# Altium integrated library 7490120110_Altium_WE-LAN_rev20b.IntLib: 42 symbols
Pins are listed as number, name and electrical type; pins without a type are passive.

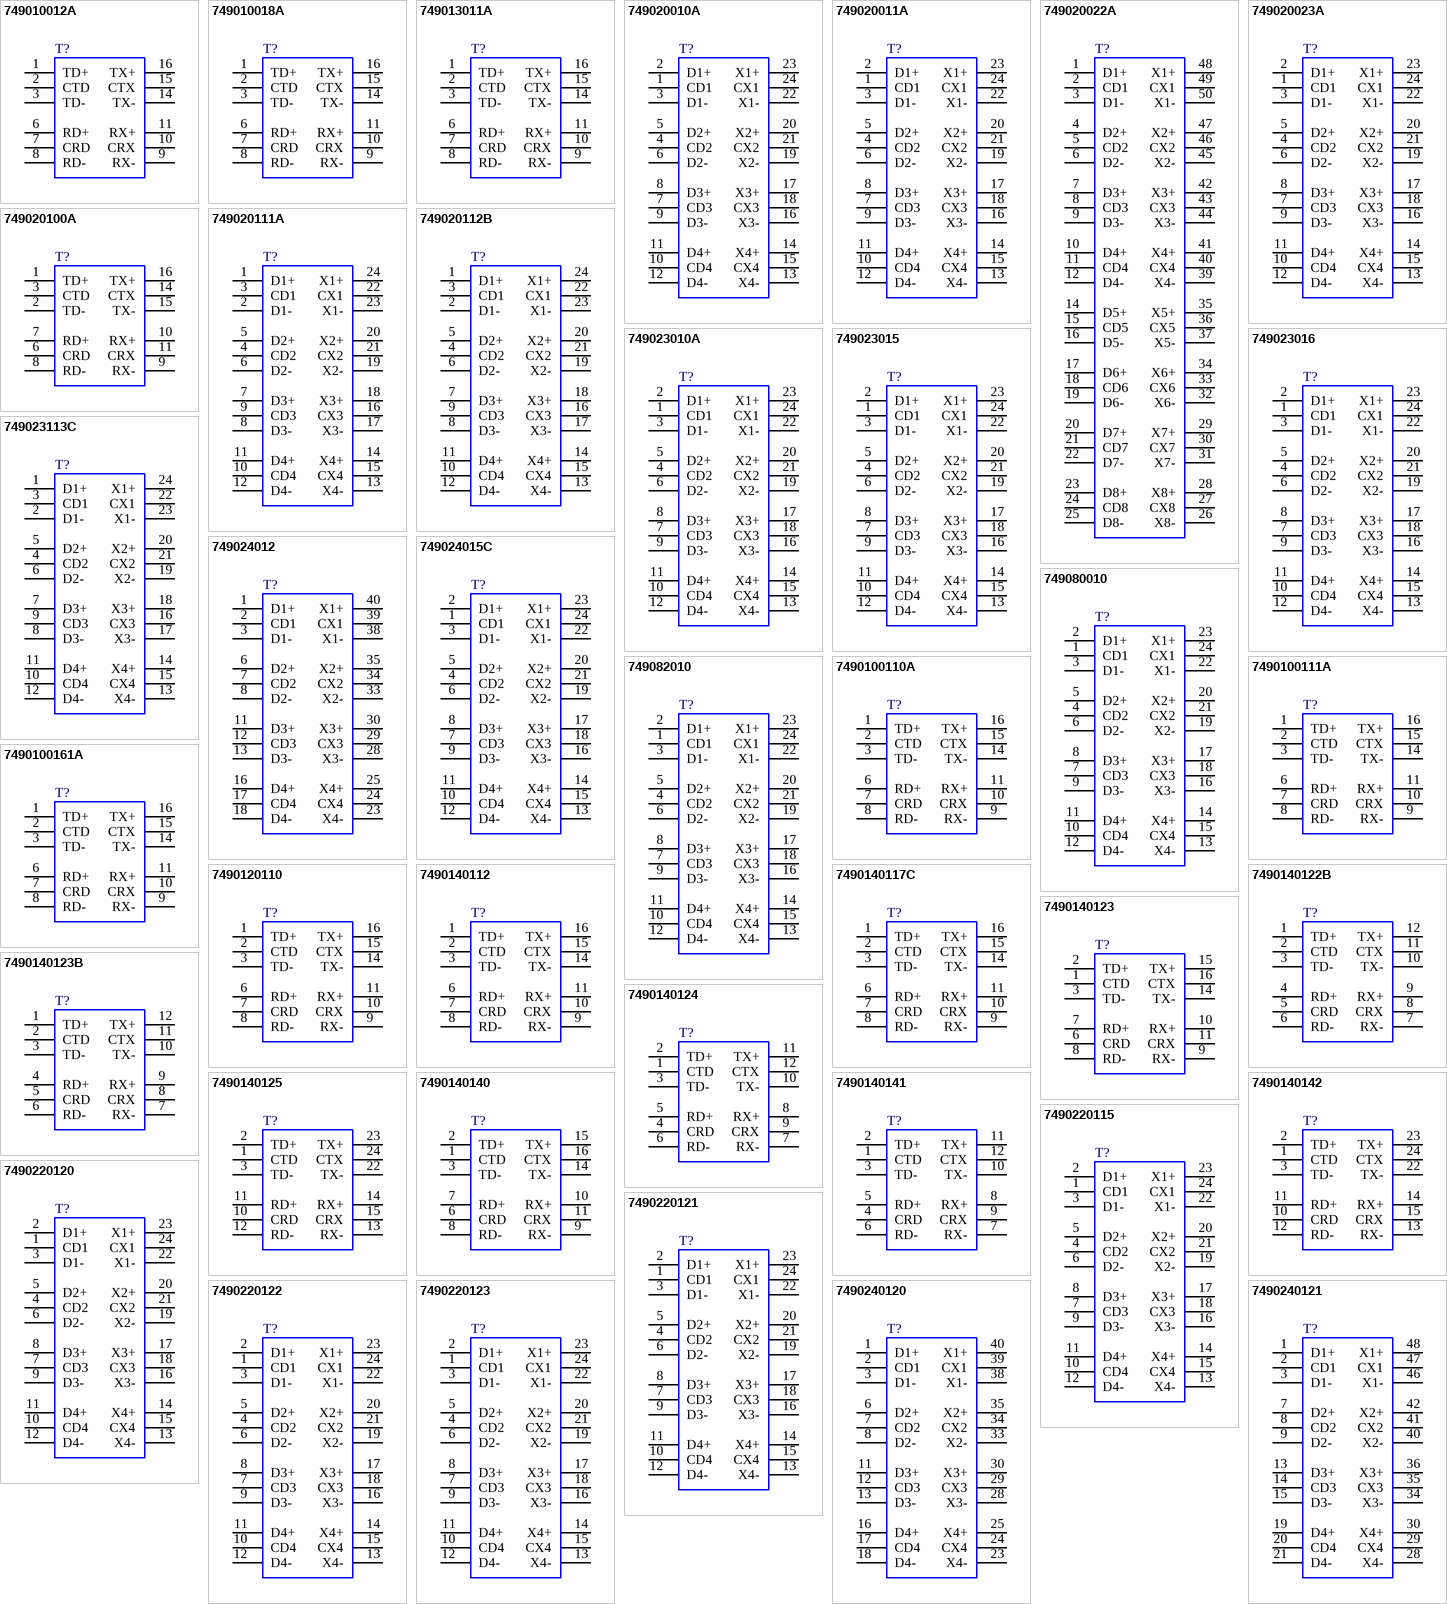
[diagram p0: symbols 749010012A to 7490240121]

## 749010012A
designator T?
WE-LAN LAN Transformer, SMT, 10/100 Base-T, 1 port; Manufacturer Part Number: 749010012A; Manufacturer: Wurth Elektronik; PoE Current: 0; Turns Ratio: 1:1; HPLE: No; Number of Ports: 1; Inductance: 350uH; Insulation Test Voltage: 1500Vrms; ComponentLink1Description: Manufacturer; ComponentLink1URL: http://www.we-online.de; ComponentLink2Description: Datasheet; ComponentLink2URL: https://www.we-online.com/catalog/datasheet/749010012A.pdf; Operating Temperature: 0 to +70degC; Published Date: March 2020; Packaging: Tape and Reel; Data Rate: 10/100 Base-T; Mounting Technology: SMT
footprint 749010012A
pins: 1 TD+, 2 CTD, 3 TD-, 6 RD+, 7 CRD, 8 RD-, 9 RX-, 10 CRX, 11 RX+, 14 TX-, 15 CTX, 16 TX+

## 749010018A
designator T?
WE-LAN LAN Transformer, SMT, 10/100 Base-T, 1 port; Manufacturer Part Number: 749010018A; Manufacturer: Wurth Elektronik; PoE Current: 0; Turns Ratio: 1:1; HPLE: No; Number of Ports: 1; Inductance: 350uH; Insulation Test Voltage: 1500Vrms; ComponentLink1Description: Manufacturer; ComponentLink1URL: http://www.we-online.de; ComponentLink2Description: Datasheet; ComponentLink2URL: https://www.we-online.com/catalog/datasheet/749010018A.pdf; Operating Temperature: -40 to +85degC; Published Date: March 2020; Packaging: Tape and Reel; Data Rate: 10/100 Base-T; Mounting Technology: SMT
footprint 749010018A
pins: 1 TD+, 2 CTD, 3 TD-, 6 RD+, 7 CRD, 8 RD-, 9 RX-, 10 CRX, 11 RX+, 14 TX-, 15 CTX, 16 TX+

## 749013011A
designator T?
WE-LAN LAN Transformer, SMT, 10/100 Base-T, 1 port; Manufacturer Part Number: 749013011A; Manufacturer: Wurth Elektronik; PoE Current: 350mA; Turns Ratio: 1:1; HPLE: No; Number of Ports: 1; Inductance: 350uH; Insulation Test Voltage: 1500Vrms; ComponentLink1Description: Manufacturer; ComponentLink1URL: http://www.we-online.de; ComponentLink2Description: Datasheet; ComponentLink2URL: https://www.we-online.com/catalog/datasheet/749013011A.pdf; Operating Temperature: -40 to +105degC; Published Date: March 2020; Packaging: Tape and Reel; Data Rate: 10/100 Base-T; Mounting Technology: SMT
footprint 749013011A
pins: 1 TD+, 2 CTD, 3 TD-, 6 RD+, 7 CRD, 8 RD-, 9 RX-, 10 CRX, 11 RX+, 14 TX-, 15 CTX, 16 TX+

## 749020010A
designator T?
WE-LAN LAN Transformer, SMT, 1000 Base-T, 1 port; Manufacturer Part Number: 749020010A; Manufacturer: Wurth Elektronik; PoE Current: 0; Turns Ratio: 1:1; HPLE: No; Number of Ports: 1; Inductance: 350uH; Insulation Test Voltage: 1500Vrms; ComponentLink1Description: Manufacturer; ComponentLink1URL: http://www.we-online.de; ComponentLink2Description: Datasheet; ComponentLink2URL: https://www.we-online.com/catalog/datasheet/749020010A.pdf; Operating Temperature: -40 to +85degC; Published Date: March 2020; Packaging: Tape and Reel; Data Rate: 1000 Base-T; Mounting Technology: SMT
footprint 749020010A
pins: 1 CD1, 2 D1+, 3 D1-, 4 CD2, 5 D2+, 6 D2-, 7 CD3, 8 D3+, 9 D3-, 10 CD4, 11 D4+, 12 D4-, 13 X4-, 14 X4+, 15 CX4, 16 X3-, 17 X3+, 18 CX3, 19 X2-, 20 X2+, 21 CX2, 22 X1-, 23 X1+, 24 CX1

## 749020011A
designator T?
WE-LAN LAN Transformer, SMT, 1000 Base-T, 1 port; Manufacturer Part Number: 749020011A; Manufacturer: Wurth Elektronik; PoE Current: 0; Turns Ratio: 1:1; HPLE: No; Number of Ports: 1; Inductance: 350uH; Insulation Test Voltage: 1500Vrms; ComponentLink1Description: Manufacturer; ComponentLink1URL: http://www.we-online.de; ComponentLink2Description: Datasheet; ComponentLink2URL: https://www.we-online.com/catalog/datasheet/749020011A.pdf; Operating Temperature: -40 to +85degC; Published Date: March 2020; Packaging: Tape and Reel; Data Rate: 1000 Base-T; Mounting Technology: SMT
footprint 749020011A
pins: 1 CD1, 2 D1+, 3 D1-, 4 CD2, 5 D2+, 6 D2-, 7 CD3, 8 D3+, 9 D3-, 10 CD4, 11 D4+, 12 D4-, 13 X4-, 14 X4+, 15 CX4, 16 X3-, 17 X3+, 18 CX3, 19 X2-, 20 X2+, 21 CX2, 22 X1-, 23 X1+, 24 CX1

## 749020022A
designator T?
WE-LAN LAN Transformer, SMT, 1000 Base-T, 2 port; Manufacturer Part Number: 749020022A; Manufacturer: Wurth Elektronik; PoE Current: 0; Turns Ratio: 1:1; HPLE: No; Number of Ports: 2; Inductance: 350uH; Insulation Test Voltage: 1500Vrms; ComponentLink1Description: Manufacturer; ComponentLink1URL: http://www.we-online.de; ComponentLink2Description: Datasheet; ComponentLink2URL: https://www.we-online.com/catalog/datasheet/749020022A.pdf; Operating Temperature: -40 to +85degC; Published Date: March 2020; Packaging: Tape and Reel; Data Rate: 1000 Base-T; Mounting Technology: SMT
footprint 749020022A
pins: 1 D1+, 2 CD1, 3 D1-, 4 D2+, 5 CD2, 6 D2-, 7 D3+, 8 CD3, 9 D3-, 10 D4+, 11 CD4, 12 D4-, 14 D5+, 15 CD5, 16 D5-, 17 D6+, 18 CD6, 19 D6-, 20 D7+, 21 CD7, 22 D7-, 23 D8+, 24 CD8, 25 D8-, 26 X8-, 27 CX8, 28 X8+, 29 X7+, 30 CX7, 31 X7-, 32 X6-, 33 CX6, 34 X6+, 35 X5+, 36 CX5, 37 X5-, 39 X4-, 40 CX4, 41 X4+, 42 X3+, 43 CX3, 44 X3-, 45 X2-, 46 CX2, 47 X2+, 48 X1+, 49 CX1, 50 X1-

## 749020023A
designator T?
WE-LAN LAN Transformer, SMT, 1000 Base-T, 1 port; Manufacturer Part Number: 749020023A; Manufacturer: Wurth Elektronik; PoE Current: 0; Turns Ratio: 1:1; HPLE: No; Number of Ports: 1; Inductance: 350uH; Insulation Test Voltage: 1500Vrms; ComponentLink1Description: Manufacturer; ComponentLink1URL: http://www.we-online.de; ComponentLink2Description: Datasheet; ComponentLink2URL: https://www.we-online.com/catalog/datasheet/749020023A.pdf; Operating Temperature: -40 to +85degC; Published Date: March 2020; Packaging: Tape and Reel; Data Rate: 1000 Base-T; Mounting Technology: SMT
footprint 749020023A
pins: 1 CD1, 2 D1+, 3 D1-, 4 CD2, 5 D2+, 6 D2-, 7 CD3, 8 D3+, 9 D3-, 10 CD4, 11 D4+, 12 D4-, 13 X4-, 14 X4+, 15 CX4, 16 X3-, 17 X3+, 18 CX3, 19 X2-, 20 X2+, 21 CX2, 22 X1-, 23 X1+, 24 CX1

## 749020100A
designator T?
WE-LAN LAN Transformer, SMT, 1000 Base-T, 0.5 port; Manufacturer Part Number: 749020100A; Manufacturer: Wurth Elektronik; PoE Current: 0; Turns Ratio: 1:1; HPLE: No; Number of Ports: 0.5; Inductance: 350uH; Insulation Test Voltage: 1500Vrms; ComponentLink1Description: Manufacturer; ComponentLink1URL: http://www.we-online.de; ComponentLink2Description: Datasheet; ComponentLink2URL: https://www.we-online.com/catalog/datasheet/749020100A.pdf; Operating Temperature: -40 to +105degC; Published Date: March 2020; Packaging: Tape and Reel; Data Rate: 1000 Base-T; Mounting Technology: SMT
footprint 749020100A
pins: 1 TD+, 2 TD-, 3 CTD, 6 CRD, 7 RD+, 8 RD-, 9 RX-, 10 RX+, 11 CRX, 14 CTX, 15 TX-, 16 TX+

## 749020111A
designator T?
WE-LAN LAN Transformer, SMT, 1000 Base-T, 1 port; Manufacturer Part Number: 749020111A; Manufacturer: Wurth Elektronik; PoE Current: 0; Turns Ratio: 1:1; HPLE: No; Number of Ports: 1; Inductance: 350uH; Insulation Test Voltage: 1500Vrms; ComponentLink1Description: Manufacturer; ComponentLink1URL: http://www.we-online.de; ComponentLink2Description: Datasheet; ComponentLink2URL: https://www.we-online.com/catalog/datasheet/749020111A.pdf; Operating Temperature: 0 to +70degC; Published Date: March 2020; Packaging: Tape and Reel; Data Rate: 1000 Base-T; Mounting Technology: SMT
footprint 749020111A
pins: 1 D1+, 2 D1-, 3 CD1, 4 CD2, 5 D2+, 6 D2-, 7 D3+, 8 D3-, 9 CD3, 10 CD4, 11 D4+, 12 D4-, 13 X4-, 14 X4+, 15 CX4, 16 CX3, 17 X3-, 18 X3+, 19 X2-, 20 X2+, 21 CX2, 22 CX1, 23 X1-, 24 X1+

## 749020112B
designator T?
WE-LAN LAN Transformer, SMT, 10/100/1000 Base-T, 1 port; Manufacturer Part Number: 749020112B; Manufacturer: Wurth Elektronik; PoE Current: 0; Turns Ratio: 1:1; HPLE: No; Number of Ports: 1; Inductance: 350uH; Insulation Test Voltage: 1500Vrms; ComponentLink1Description: Manufacturer; ComponentLink1URL: http://www.we-online.de; ComponentLink2Description: Datasheet; ComponentLink2URL: https://www.we-online.com/catalog/datasheet/749020112B.pdf; Operating Temperature: -40 to +85degC; Published Date: March 2020; Packaging: Tape and Reel; Data Rate: 10/100/1000 Base-T; Mounting Technology: SMT
footprint 749020112B
pins: 1 D1+, 2 D1-, 3 CD1, 4 CD2, 5 D2+, 6 D2-, 7 D3+, 8 D3-, 9 CD3, 10 CD4, 11 D4+, 12 D4-, 13 X4-, 14 X4+, 15 CX4, 16 CX3, 17 X3-, 18 X3+, 19 X2-, 20 X2+, 21 CX2, 22 CX1, 23 X1-, 24 X1+

## 749023010A
designator T?
WE-LAN LAN Transformer, SMT, 1000 Base-T, 1 port; Manufacturer Part Number: 749023010A; Manufacturer: Wurth Elektronik; PoE Current: 350mA; Turns Ratio: 1:1; HPLE: No; Number of Ports: 1; Inductance: 350uH; Insulation Test Voltage: 1500Vrms; ComponentLink1Description: Manufacturer; ComponentLink1URL: http://www.we-online.de; ComponentLink2Description: Datasheet; ComponentLink2URL: https://www.we-online.com/catalog/datasheet/749023010A.pdf; Operating Temperature: 0 to +70degC; Published Date: March 2020; Packaging: Tape and Reel; Data Rate: 1000 Base-T; Mounting Technology: SMT
footprint 749023010A
pins: 1 CD1, 2 D1+, 3 D1-, 4 CD2, 5 D2+, 6 D2-, 7 CD3, 8 D3+, 9 D3-, 10 CD4, 11 D4+, 12 D4-, 13 X4-, 14 X4+, 15 CX4, 16 X3-, 17 X3+, 18 CX3, 19 X2-, 20 X2+, 21 CX2, 22 X1-, 23 X1+, 24 CX1

## 749023015
designator T?
WE-LAN LAN Transformer, SMT, 1000 Base-T, 1 port; Manufacturer Part Number: 749023015; Manufacturer: Wurth Elektronik; PoE Current: 350mA; Turns Ratio: 1:1; HPLE: Yes; Number of Ports: 1; Inductance: 350uH; Insulation Test Voltage: 1500Vrms; ComponentLink1Description: Manufacturer; ComponentLink1URL: http://www.we-online.de; ComponentLink2Description: Datasheet; ComponentLink2URL: https://www.we-online.com/catalog/datasheet/749023015.pdf; Operating Temperature: 0 to +70degC; Published Date: March 2020; Packaging: Tape and Reel; Data Rate: 1000 Base-T; Mounting Technology: SMT
footprint 749023015
pins: 1 CD1, 2 D1+, 3 D1-, 4 CD2, 5 D2+, 6 D2-, 7 CD3, 8 D3+, 9 D3-, 10 CD4, 11 D4+, 12 D4-, 13 X4-, 14 X4+, 15 CX4, 16 X3-, 17 X3+, 18 CX3, 19 X2-, 20 X2+, 21 CX2, 22 X1-, 23 X1+, 24 CX1

## 749023016
designator T?
WE-LAN LAN Transformer, SMT, 1000 Base-T, 1 port; Manufacturer Part Number: 749023016; Manufacturer: Wurth Elektronik; PoE Current: 350mA; Turns Ratio: 1:1; HPLE: Yes; Number of Ports: 1; Inductance: 350uH; Insulation Test Voltage: 1500Vrms; ComponentLink1Description: Manufacturer; ComponentLink1URL: http://www.we-online.de; ComponentLink2Description: Datasheet; ComponentLink2URL: https://www.we-online.com/catalog/datasheet/749023016.pdf; Operating Temperature: 0 to +70degC; Published Date: March 2020; Packaging: Tape and Reel; Data Rate: 1000 Base-T; Mounting Technology: SMT
footprint 749023016
pins: 1 CD1, 2 D1+, 3 D1-, 4 CD2, 5 D2+, 6 D2-, 7 CD3, 8 D3+, 9 D3-, 10 CD4, 11 D4+, 12 D4-, 13 X4-, 14 X4+, 15 CX4, 16 X3-, 17 X3+, 18 CX3, 19 X2-, 20 X2+, 21 CX2, 22 X1-, 23 X1+, 24 CX1

## 749023113C
designator T?
WE-LAN LAN Transformer, SMT, 1000 Base-T, 1 port; Manufacturer Part Number: 749023113C; Manufacturer: Wurth Elektronik; PoE Current: 350mA; Turns Ratio: 1:1; HPLE: No; Number of Ports: 1; Inductance: 350uH; Insulation Test Voltage: 1500Vrms; ComponentLink1Description: Manufacturer; ComponentLink1URL: http://www.we-online.de; ComponentLink2Description: Datasheet; ComponentLink2URL: https://www.we-online.com/catalog/datasheet/749023113C.pdf; Operating Temperature: -40 to +85degC; Published Date: March 2020; Packaging: Tape and Reel; Data Rate: 1000 Base-T; Mounting Technology: SMT
footprint 749023113C
pins: 1 D1+, 2 D1-, 3 CD1, 4 CD2, 5 D2+, 6 D2-, 7 D3+, 8 D3-, 9 CD3, 10 CD4, 11 D4+, 12 D4-, 13 X4-, 14 X4+, 15 CX4, 16 CX3, 17 X3-, 18 X3+, 19 X2-, 20 X2+, 21 CX2, 22 CX1, 23 X1-, 24 X1+

## 749024012
designator T?
WE-LAN LAN Transformer, SMT, 1000 Base-T, 1 port; Manufacturer Part Number: 749024012; Manufacturer: Wurth Elektronik; PoE Current: 0; Turns Ratio: 1:1; HPLE: No; Number of Ports: 1; Inductance: 350uH; Insulation Test Voltage: 4000Vrms; ComponentLink1Description: Manufacturer; ComponentLink1URL: http://www.we-online.de; ComponentLink2Description: Datasheet; ComponentLink2URL: https://www.we-online.com/catalog/datasheet/749024012.pdf; Operating Temperature: -40 to +85degC; Published Date: March 2020; Packaging: Tape and Reel; Data Rate: 1000 Base-T; Mounting Technology: SMT
footprint 749024012
pins: 1 D1+, 2 CD1, 3 D1-, 6 D2+, 7 CD2, 8 D2-, 11 D3+, 12 CD3, 13 D3-, 16 D4+, 17 CD4, 18 D4-, 23 X4-, 24 CX4, 25 X4+, 28 X3-, 29 CX3, 30 X3+, 33 X2-, 34 CX2, 35 X2+, 38 X1-, 39 CX1, 40 X1+

## 749024015C
designator T?
WE-LAN LAN Transformer, SMT, 1000 Base-T, 1 port; Manufacturer Part Number: 749024015C; Manufacturer: Wurth Elektronik; PoE Current: 0; Turns Ratio: 1:1; HPLE: No; Number of Ports: 1; Inductance: 350uH; Insulation Test Voltage: 1500Vrms; ComponentLink1Description: Manufacturer; ComponentLink1URL: http://www.we-online.de; ComponentLink2Description: Datasheet; ComponentLink2URL: https://www.we-online.com/catalog/datasheet/749024015C.pdf; Operating Temperature: -40 to +85degC; Published Date: March 2020; Packaging: Tape and Reel; Data Rate: 1000 Base-T; Mounting Technology: SMT
footprint 749024015C
pins: 1 CD1, 2 D1+, 3 D1-, 4 CD2, 5 D2+, 6 D2-, 7 CD3, 8 D3+, 9 D3-, 10 CD4, 11 D4+, 12 D4-, 13 X4-, 14 X4+, 15 CX4, 16 X3-, 17 X3+, 18 CX3, 19 X2-, 20 X2+, 21 CX2, 22 X1-, 23 X1+, 24 CX1

## 749080010
designator T?
WE-LAN LAN Transformer, SMT, 2.5G/5G Base-T, 1 port; Manufacturer Part Number: 749080010; Manufacturer: Wurth Elektronik; PoE Current: 0; Turns Ratio: 1:1; HPLE: No; Number of Ports: 1; Inductance: 200uH; Insulation Test Voltage: 1500Vrms; ComponentLink1Description: Manufacturer; ComponentLink1URL: http://www.we-online.de; ComponentLink2Description: Datasheet; ComponentLink2URL: https://www.we-online.com/catalog/datasheet/749080010.pdf; Operating Temperature: -40 to +85degC; Published Date: March 2020; Packaging: Tape and Reel; Data Rate: 2.5G/5G Base-T; Mounting Technology: SMT
footprint 749080010
pins: 1 CD1, 2 D1+, 3 D1-, 4 CD2, 5 D2+, 6 D2-, 7 CD3, 8 D3+, 9 D3-, 10 CD4, 11 D4+, 12 D4-, 13 X4-, 14 X4+, 15 CX4, 16 X3-, 17 X3+, 18 CX3, 19 X2-, 20 X2+, 21 CX2, 22 X1-, 23 X1+, 24 CX1

## 749082010
designator T?
WE-LAN LAN Transformer, SMT, 2.5G/5G Base-T, 1 port; Manufacturer Part Number: 749082010; Manufacturer: Wurth Elektronik; PoE Current: 0; Turns Ratio: 1:1; HPLE: No; Number of Ports: 1; Inductance: 120uH; Insulation Test Voltage: 1500Vrms; ComponentLink1Description: Manufacturer; ComponentLink1URL: http://www.we-online.de; ComponentLink2Description: Datasheet; ComponentLink2URL: https://www.we-online.com/catalog/datasheet/749082010.pdf; Operating Temperature: -40 to +85degC; Published Date: March 2020; Packaging: Tape and Reel; Data Rate: 2.5G/5G Base-T; Mounting Technology: SMT
footprint 749082010
pins: 1 CD1, 2 D1+, 3 D1-, 4 CD2, 5 D2+, 6 D2-, 7 CD3, 8 D3+, 9 D3-, 10 CD4, 11 D4+, 12 D4-, 13 X4-, 14 X4+, 15 CX4, 16 X3-, 17 X3+, 18 CX3, 19 X2-, 20 X2+, 21 CX2, 22 X1-, 23 X1+, 24 CX1

## 7490100110A
designator T?
WE-LAN LAN Transformer, SMT, 10/100 Base-T, 1 port; Manufacturer Part Number: 7490100110A; Manufacturer: Wurth Elektronik; PoE Current: 0; Turns Ratio: 1:1; HPLE: No; Number of Ports: 1; Inductance: 350uH; Insulation Test Voltage: 1500Vrms; ComponentLink1Description: Manufacturer; ComponentLink1URL: http://www.we-online.de; ComponentLink2Description: Datasheet; ComponentLink2URL: https://www.we-online.com/catalog/datasheet/7490100110A.pdf; Operating Temperature: 0 to +70degC; Published Date: March 2020; Packaging: Tape and Reel; Data Rate: 10/100 Base-T; Mounting Technology: SMT
footprint 7490100110A
pins: 1 TD+, 2 CTD, 3 TD-, 6 RD+, 7 CRD, 8 RD-, 9 RX-, 10 CRX, 11 RX+, 14 TX-, 15 CTX, 16 TX+

## 7490100111A
designator T?
WE-LAN LAN Transformer, SMT, 10/100 Base-T, 1 port; Manufacturer Part Number: 7490100111A; Manufacturer: Wurth Elektronik; PoE Current: 0; Turns Ratio: 1:1; HPLE: No; Number of Ports: 1; Inductance: 350uH; Insulation Test Voltage: 1500Vrms; ComponentLink1Description: Manufacturer; ComponentLink1URL: http://www.we-online.de; ComponentLink2Description: Datasheet; ComponentLink2URL: https://www.we-online.com/catalog/datasheet/7490100111A.pdf; Operating Temperature: -40 to +105degC; Published Date: March 2020; Packaging: Tape and Reel; Data Rate: 10/100 Base-T; Mounting Technology: SMT
footprint 7490100111A
pins: 1 TD+, 2 CTD, 3 TD-, 6 RD+, 7 CRD, 8 RD-, 9 RX-, 10 CRX, 11 RX+, 14 TX-, 15 CTX, 16 TX+

## 7490100161A
designator T?
WE-LAN LAN Transformer, SMT, 10/100 Base-T, 1 port; Manufacturer Part Number: 7490100161A; Manufacturer: Wurth Elektronik; PoE Current: 0; Turns Ratio: 1:1; HPLE: No; Number of Ports: 1; Inductance: 350uH; Insulation Test Voltage: 1500Vrms; ComponentLink1Description: Manufacturer; ComponentLink1URL: http://www.we-online.de; ComponentLink2Description: Datasheet; ComponentLink2URL: https://www.we-online.com/catalog/datasheet/7490100161A.pdf; Operating Temperature: -40 to +125degC; Published Date: March 2020; Packaging: Tape and Reel; Data Rate: 10/100 Base-T; Mounting Technology: SMT
footprint 7490100161A
pins: 1 TD+, 2 CTD, 3 TD-, 6 RD+, 7 CRD, 8 RD-, 9 RX-, 10 CRX, 11 RX+, 14 TX-, 15 CTX, 16 TX+

## 7490120110
designator T?
WE-LAN LAN Transformer, SMT, 10/100 Base-T, 1 port; Manufacturer Part Number: 7490120110; Manufacturer: Wurth Elektronik; PoE Current: 720mA; Turns Ratio: 1:1; HPLE: No; Number of Ports: 1; Inductance: 120uH; Insulation Test Voltage: 1500Vrms; ComponentLink1Description: Manufacturer; ComponentLink1URL: http://www.we-online.de; ComponentLink2Description: Datasheet; ComponentLink2URL: https://www.we-online.com/catalog/datasheet/7490120110.pdf; Operating Temperature: -40 to +85degC; Published Date: March 2020; Packaging: Tape and Reel; Data Rate: 10/100 Base-T; Mounting Technology: SMT
footprint 7490120110
pins: 1 TD+, 2 CTD, 3 TD-, 6 RD+, 7 CRD, 8 RD-, 9 RX-, 10 CRX, 11 RX+, 14 TX-, 15 CTX, 16 TX+

## 7490140112
designator T?
WE-LAN LAN Transformer, SMT, 10/100 Base-T, 1 port; Manufacturer Part Number: 7490140112; Manufacturer: Wurth Elektronik; PoE Current: 0; Turns Ratio: 1:1; HPLE: No; Number of Ports: 1; Inductance: 350uH; Insulation Test Voltage: 6000Vrms; ComponentLink1Description: Manufacturer; ComponentLink1URL: http://www.we-online.de; ComponentLink2Description: Datasheet; ComponentLink2URL: https://www.we-online.com/catalog/datasheet/7490140112.pdf; Operating Temperature: -40 to +85degC; Published Date: March 2020; Packaging: Tape and Reel; Data Rate: 10/100 Base-T; Mounting Technology: SMT
footprint 7490140112
pins: 1 TD+, 2 CTD, 3 TD-, 6 RD+, 7 CRD, 8 RD-, 9 RX-, 10 CRX, 11 RX+, 14 TX-, 15 CTX, 16 TX+

## 7490140117C
designator T?
WE-LAN LAN Transformer, SMT, 10/100 Base-T, 1 port; Manufacturer Part Number: 7490140117C; Manufacturer: Wurth Elektronik; PoE Current: 0; Turns Ratio: 1:1; HPLE: No; Number of Ports: 1; Inductance: 350uH; Insulation Test Voltage: 2500Vrms; ComponentLink1Description: Manufacturer; ComponentLink1URL: http://www.we-online.de; ComponentLink2Description: Datasheet; ComponentLink2URL: https://www.we-online.com/catalog/datasheet/7490140117C.pdf; Operating Temperature: -40 to +105degC; Published Date: March 2020; Packaging: Tape and Reel; Data Rate: 10/100 Base-T; Mounting Technology: SMT
footprint 7490140117C
pins: 1 TD+, 2 CTD, 3 TD-, 6 RD+, 7 CRD, 8 RD-, 9 RX-, 10 CRX, 11 RX+, 14 TX-, 15 CTX, 16 TX+

## 7490140122B
designator T?
WE-LAN LAN Transformer, SMT, 10/100 Base-T, 1 port; Manufacturer Part Number: 7490140122B; Manufacturer: Wurth Elektronik; PoE Current: 0; Turns Ratio: 1:1; HPLE: No; Number of Ports: 1; Inductance: 350uH; Insulation Test Voltage: 4500Vrms; ComponentLink1Description: Manufacturer; ComponentLink1URL: http://www.we-online.de; ComponentLink2Description: Datasheet; ComponentLink2URL: https://www.we-online.com/catalog/datasheet/7490140122B.pdf; Operating Temperature: -40 to +85degC; Published Date: March 2020; Packaging: Tape and Reel; Data Rate: 10/100 Base-T; Mounting Technology: SMT
footprint 7490140122B
pins: 1 TD+, 2 CTD, 3 TD-, 4 RD+, 5 CRD, 6 RD-, 7 RX-, 8 CRX, 9 RX+, 10 TX-, 11 CTX, 12 TX+

## 7490140123
designator T?
WE-LAN LAN Transformer, SMT, 10/100 Base-T, 1 port; Manufacturer Part Number: 7490140123; Manufacturer: Wurth Elektronik; PoE Current: 350mA; Turns Ratio: 1:1; HPLE: No; Number of Ports: 1; Inductance: 350uH; Insulation Test Voltage: 1500Vrms; ComponentLink1Description: Manufacturer; ComponentLink1URL: http://www.we-online.de; ComponentLink2Description: Datasheet; ComponentLink2URL: https://www.we-online.com/catalog/datasheet/7490140123.pdf; Operating Temperature: -40 to +85degC; Published Date: March 2020; Packaging: Tape and Reel; Data Rate: 10/100 Base-T; Mounting Technology: SMT
footprint 7490140123
pins: 1 CTD, 2 TD+, 3 TD-, 6 CRD, 7 RD+, 8 RD-, 9 RX-, 10 RX+, 11 CRX, 14 TX-, 15 TX+, 16 CTX

## 7490140123B
designator T?
WE-LAN LAN Transformer, SMT, 10/100 Base-T, 1 port; Manufacturer Part Number: 7490140123B; Manufacturer: Wurth Elektronik; PoE Current: 0; Turns Ratio: 1:1; HPLE: No; Number of Ports: 1; Inductance: 350uH; Insulation Test Voltage: 4500Vrms; ComponentLink1Description: Manufacturer; ComponentLink1URL: http://www.we-online.de; ComponentLink2Description: Datasheet; ComponentLink2URL: https://www.we-online.com/catalog/datasheet/7490140123B.pdf; Operating Temperature: -40 to +85degC; Published Date: March 2020; Packaging: Tape and Reel; Data Rate: 10/100 Base-T; Mounting Technology: SMT
footprint 7490140123B
pins: 1 TD+, 2 CTD, 3 TD-, 4 RD+, 5 CRD, 6 RD-, 7 RX-, 8 CRX, 9 RX+, 10 TX-, 11 CTX, 12 TX+

## 7490140124
designator T?
WE-LAN LAN Transformer, SMT, 10/100 Base-T, 1 port; Manufacturer Part Number: 7490140124; Manufacturer: Wurth Elektronik; PoE Current: 0; Turns Ratio: 1:1; HPLE: No; Number of Ports: 1; Inductance: 350uH; Insulation Test Voltage: 1500Vrms; ComponentLink1Description: Manufacturer; ComponentLink1URL: http://www.we-online.de; ComponentLink2Description: Datasheet; ComponentLink2URL: https://www.we-online.com/catalog/datasheet/7490140124.pdf; Operating Temperature: -40 to +85degC; Published Date: March 2020; Packaging: Tape and Reel; Data Rate: 10/100 Base-T; Mounting Technology: SMT
footprint 7490140124
pins: 1 CTD, 2 TD+, 3 TD-, 4 CRD, 5 RD+, 6 RD-, 7 RX-, 8 RX+, 9 CRX, 10 TX-, 11 TX+, 12 CTX

## 7490140125
designator T?
WE-LAN LAN Transformer, SMT, 10/100 Base-T, 1 port; Manufacturer Part Number: 7490140125; Manufacturer: Wurth Elektronik; PoE Current: 350mA; Turns Ratio: 1:1; HPLE: No; Number of Ports: 1; Inductance: 350uH; Insulation Test Voltage: 1500Vrms; ComponentLink1Description: Manufacturer; ComponentLink1URL: http://www.we-online.de; ComponentLink2Description: Datasheet; ComponentLink2URL: https://www.we-online.com/catalog/datasheet/7490140125.pdf; Operating Temperature: -40 to +85degC; Published Date: March 2020; Packaging: Tape and Reel; Data Rate: 10/100 Base-T; Mounting Technology: SMT
footprint 7490140125
pins: 1 CTD, 2 TD+, 3 TD-, 10 CRD, 11 RD+, 12 RD-, 13 RX-, 14 RX+, 15 CRX, 22 TX-, 23 TX+, 24 CTX

## 7490140140
designator T?
WE-LAN LAN Transformer, SMT, 10/100 Base-T, 1 port; Manufacturer Part Number: 7490140140; Manufacturer: Wurth Elektronik; PoE Current: 350mA; Turns Ratio: 1:1; HPLE: No; Number of Ports: 1; Inductance: 350uH; Insulation Test Voltage: 4000Vrms; ComponentLink1Description: Manufacturer; ComponentLink1URL: http://www.we-online.de; ComponentLink2Description: Datasheet; ComponentLink2URL: https://www.we-online.com/catalog/datasheet/7490140140.pdf; Operating Temperature: -40 to +85degC; Published Date: March 2020; Packaging: Tape and Reel; Data Rate: 10/100 Base-T; Mounting Technology: SMT
footprint 7490140140
pins: 1 CTD, 2 TD+, 3 TD-, 6 CRD, 7 RD+, 8 RD-, 9 RX-, 10 RX+, 11 CRX, 14 TX-, 15 TX+, 16 CTX

## 7490140141
designator T?
WE-LAN LAN Transformer, SMT, 10/100 Base-T, 1 port; Manufacturer Part Number: 7490140141; Manufacturer: Wurth Elektronik; PoE Current: 350mA; Turns Ratio: 1:1; HPLE: No; Number of Ports: 1; Inductance: 350uH; Insulation Test Voltage: 4000Vrms; ComponentLink1Description: Manufacturer; ComponentLink1URL: http://www.we-online.de; ComponentLink2Description: Datasheet; ComponentLink2URL: https://www.we-online.com/catalog/datasheet/7490140141.pdf; Operating Temperature: -40 to +85degC; Published Date: March 2020; Packaging: Tape and Reel; Data Rate: 10/100 Base-T; Mounting Technology: SMT
footprint 7490140141
pins: 1 CTD, 2 TD+, 3 TD-, 4 CRD, 5 RD+, 6 RD-, 7 RX-, 8 RX+, 9 CRX, 10 TX-, 11 TX+, 12 CTX

## 7490140142
designator T?
WE-LAN LAN Transformer, SMT, 10/100 Base-T, 1 port; Manufacturer Part Number: 7490140142; Manufacturer: Wurth Elektronik; PoE Current: 350mA; Turns Ratio: 1:1; HPLE: No; Number of Ports: 1; Inductance: 350uH; Insulation Test Voltage: 4000Vrms; ComponentLink1Description: Manufacturer; ComponentLink1URL: http://www.we-online.de; ComponentLink2Description: Datasheet; ComponentLink2URL: https://www.we-online.com/catalog/datasheet/7490140142.pdf; Operating Temperature: -40 to +85degC; Published Date: March 2020; Packaging: Tape and Reel; Data Rate: 10/100 Base-T; Mounting Technology: SMT
footprint 7490140142
pins: 1 CTD, 2 TD+, 3 TD-, 10 CRD, 11 RD+, 12 RD-, 13 RX-, 14 RX+, 15 CRX, 22 TX-, 23 TX+, 24 CTX

## 7490220115
designator T?
WE-LAN LAN Transformer, SMT, 1000 Base-T, 1 port; Manufacturer Part Number: 7490220115; Manufacturer: Wurth Elektronik; PoE Current: 800mA; Turns Ratio: 1:1; HPLE: No; Number of Ports: 1; Inductance: 350uH; Insulation Test Voltage: 1500Vrms; ComponentLink1Description: Manufacturer; ComponentLink1URL: http://www.we-online.de; ComponentLink2Description: Datasheet; ComponentLink2URL: https://www.we-online.com/catalog/datasheet/7490220115.pdf; Operating Temperature: -40 to +85degC; Published Date: March 2020; Packaging: Tape and Reel; Data Rate: 1000 Base-T; Mounting Technology: SMT
footprint 7490220115
pins: 1 CD1, 2 D1+, 3 D1-, 4 CD2, 5 D2+, 6 D2-, 7 CD3, 8 D3+, 9 D3-, 10 CD4, 11 D4+, 12 D4-, 13 X4-, 14 X4+, 15 CX4, 16 X3-, 17 X3+, 18 CX3, 19 X2-, 20 X2+, 21 CX2, 22 X1-, 23 X1+, 24 CX1

## 7490220120
designator T?
WE-LAN LAN Transformer, SMT, 1000 Base-T, 1 port; Manufacturer Part Number: 7490220120; Manufacturer: Wurth Elektronik; PoE Current: 350mA; Turns Ratio: 1:1; HPLE: No; Number of Ports: 1; Inductance: 350uH; Insulation Test Voltage: 1500Vrms; ComponentLink1Description: Manufacturer; ComponentLink1URL: http://www.we-online.de; ComponentLink2Description: Datasheet; ComponentLink2URL: https://www.we-online.com/catalog/datasheet/7490220120.pdf; Operating Temperature: -40 to +85degC; Published Date: March 2020; Packaging: Tape and Reel; Data Rate: 1000 Base-T; Mounting Technology: SMT
footprint 7490220120
pins: 1 CD1, 2 D1+, 3 D1-, 4 CD2, 5 D2+, 6 D2-, 7 CD3, 8 D3+, 9 D3-, 10 CD4, 11 D4+, 12 D4-, 13 X4-, 14 X4+, 15 CX4, 16 X3-, 17 X3+, 18 CX3, 19 X2-, 20 X2+, 21 CX2, 22 X1-, 23 X1+, 24 CX1

## 7490220121
designator T?
WE-LAN LAN Transformer, SMT, 1000 Base-T, 1 port; Manufacturer Part Number: 7490220121; Manufacturer: Wurth Elektronik; PoE Current: 600mA; Turns Ratio: 1:1; HPLE: No; Number of Ports: 1; Inductance: 350uH; Insulation Test Voltage: 1500Vrms; ComponentLink1Description: Manufacturer; ComponentLink1URL: http://www.we-online.de; ComponentLink2Description: Datasheet; ComponentLink2URL: https://www.we-online.com/catalog/datasheet/7490220121.pdf; Operating Temperature: -40 to +105degC; Published Date: March 2020; Packaging: Tape and Reel; Data Rate: 1000 Base-T; Mounting Technology: SMT
footprint 7490220121
pins: 1 CD1, 2 D1+, 3 D1-, 4 CD2, 5 D2+, 6 D2-, 7 CD3, 8 D3+, 9 D3-, 10 CD4, 11 D4+, 12 D4-, 13 X4-, 14 X4+, 15 CX4, 16 X3-, 17 X3+, 18 CX3, 19 X2-, 20 X2+, 21 CX2, 22 X1-, 23 X1+, 24 CX1

## 7490220122
designator T?
WE-LAN LAN Transformer, SMT, 1000 Base-T, 1 port; Manufacturer Part Number: 7490220122; Manufacturer: Wurth Elektronik; PoE Current: 1000mA; Turns Ratio: 1:1; HPLE: No; Number of Ports: 1; Inductance: 350uH; Insulation Test Voltage: 1500Vrms; ComponentLink1Description: Manufacturer; ComponentLink1URL: http://www.we-online.de; ComponentLink2Description: Datasheet; ComponentLink2URL: https://www.we-online.com/catalog/datasheet/7490220122.pdf; Operating Temperature: -40 to +85degC; Published Date: March 2020; Packaging: Tape and Reel; Data Rate: 1000 Base-T; Mounting Technology: SMT
footprint 7490220122
pins: 1 CD1, 2 D1+, 3 D1-, 4 CD2, 5 D2+, 6 D2-, 7 CD3, 8 D3+, 9 D3-, 10 CD4, 11 D4+, 12 D4-, 13 X4-, 14 X4+, 15 CX4, 16 X3-, 17 X3+, 18 CX3, 19 X2-, 20 X2+, 21 CX2, 22 X1-, 23 X1+, 24 CX1

## 7490220123
designator T?
WE-LAN LAN Transformer, SMT, 1000 Base-T, 1 port; Manufacturer Part Number: 7490220123; Manufacturer: Wurth Elektronik; PoE Current: 1500mA; Turns Ratio: 1:1; HPLE: No; Number of Ports: 1; Inductance: 200uH; Insulation Test Voltage: 1500Vrms; ComponentLink1Description: Manufacturer; ComponentLink1URL: http://www.we-online.de; ComponentLink2Description: Datasheet; ComponentLink2URL: https://www.we-online.com/catalog/datasheet/7490220123.pdf; Operating Temperature: -40 to +105degC; Published Date: March 2020; Packaging: Tape and Reel; Data Rate: 1000 Base-T; Mounting Technology: SMT
footprint 7490220123
pins: 1 CD1, 2 D1+, 3 D1-, 4 CD2, 5 D2+, 6 D2-, 7 CD3, 8 D3+, 9 D3-, 10 CD4, 11 D4+, 12 D4-, 13 X4-, 14 X4+, 15 CX4, 16 X3-, 17 X3+, 18 CX3, 19 X2-, 20 X2+, 21 CX2, 22 X1-, 23 X1+, 24 CX1

## 7490240120
designator T?
WE-LAN LAN Transformer, SMT, 1000 Base-T, 1 port; Manufacturer Part Number: 7490240120; Manufacturer: Wurth Elektronik; PoE Current: 0; Turns Ratio: 1:1; HPLE: No; Number of Ports: 1; Inductance: 350uH; Insulation Test Voltage: 4000Vrms; ComponentLink1Description: Manufacturer; ComponentLink1URL: http://www.we-online.de; ComponentLink2Description: Datasheet; ComponentLink2URL: https://www.we-online.com/catalog/datasheet/7490240120.pdf; Operating Temperature: -40 to +105degC; Published Date: March 2020; Packaging: Tape and Reel; Data Rate: 1000 Base-T; Mounting Technology: SMT
footprint 7490240120
pins: 1 D1+, 2 CD1, 3 D1-, 6 D2+, 7 CD2, 8 D2-, 11 D3+, 12 CD3, 13 D3-, 16 D4+, 17 CD4, 18 D4-, 23 X4-, 24 CX4, 25 X4+, 28 X3-, 29 CX3, 30 X3+, 33 X2-, 34 CX2, 35 X2+, 38 X1-, 39 CX1, 40 X1+

## 7490240121
designator T?
WE-LAN LAN Transformer, SMT, 1000 Base-T, 1 port; Manufacturer Part Number: 7490240121; Manufacturer: Wurth Elektronik; PoE Current: 0; Turns Ratio: 1:1; HPLE: No; Number of Ports: 1; Inductance: 350uH; Insulation Test Voltage: 1500Vrms; ComponentLink1Description: Manufacturer; ComponentLink1URL: http://www.we-online.de; ComponentLink2Description: Datasheet; ComponentLink2URL: https://www.we-online.com/catalog/datasheet/7490240121.pdf; Operating Temperature: -40 to +85degC; Published Date: March 2020; Packaging: Tape and Reel; Data Rate: 1000 Base-T; Mounting Technology: SMT
footprint 7490240121
pins: 1 D1+, 2 CD1, 3 D1-, 7 D2+, 8 CD2, 9 D2-, 13 D3+, 14 CD3, 15 D3-, 19 D4+, 20 CD4, 21 D4-, 28 X4-, 29 CX4, 30 X4+, 34 X3-, 35 CX3, 36 X3+, 40 X2-, 41 CX2, 42 X2+, 46 X1-, 47 CX1, 48 X1+

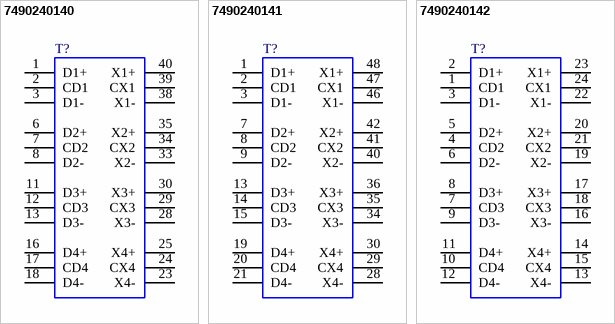
[diagram p1: symbols 7490240140 to 7490240142]

## 7490240140
designator T?
WE-LAN LAN Transformer, SMT, 1000 Base-T, 1 port; Manufacturer Part Number: 7490240140; Manufacturer: Wurth Elektronik; PoE Current: 350mA; Turns Ratio: 1:1; HPLE: No; Number of Ports: 1; Inductance: 350uH; Insulation Test Voltage: 4000Vrms; ComponentLink1Description: Manufacturer; ComponentLink1URL: http://www.we-online.de; ComponentLink2Description: Datasheet; ComponentLink2URL: https://www.we-online.com/catalog/datasheet/7490240140.pdf; Operating Temperature: -40 to +85degC; Published Date: March 2020; Packaging: Tape and Reel; Data Rate: 1000 Base-T; Mounting Technology: SMT
footprint 7490240140
pins: 1 D1+, 2 CD1, 3 D1-, 6 D2+, 7 CD2, 8 D2-, 11 D3+, 12 CD3, 13 D3-, 16 D4+, 17 CD4, 18 D4-, 23 X4-, 24 CX4, 25 X4+, 28 X3-, 29 CX3, 30 X3+, 33 X2-, 34 CX2, 35 X2+, 38 X1-, 39 CX1, 40 X1+

## 7490240141
designator T?
WE-LAN LAN Transformer, SMT, 1000 Base-T, 1 port; Manufacturer Part Number: 7490240141; Manufacturer: Wurth Elektronik; PoE Current: 350mA; Turns Ratio: 1:1; HPLE: No; Number of Ports: 1; Inductance: 350uH; Insulation Test Voltage: 4000Vrms; ComponentLink1Description: Manufacturer; ComponentLink1URL: http://www.we-online.de; ComponentLink2Description: Datasheet; ComponentLink2URL: https://www.we-online.com/catalog/datasheet/7490240141.pdf; Operating Temperature: -40 to +85degC; Published Date: March 2020; Packaging: Tape and Reel; Data Rate: 1000 Base-T; Mounting Technology: SMT
footprint 7490240141
pins: 1 D1+, 2 CD1, 3 D1-, 7 D2+, 8 CD2, 9 D2-, 13 D3+, 14 CD3, 15 D3-, 19 D4+, 20 CD4, 21 D4-, 28 X4-, 29 CX4, 30 X4+, 34 X3-, 35 CX3, 36 X3+, 40 X2-, 41 CX2, 42 X2+, 46 X1-, 47 CX1, 48 X1+

## 7490240142
designator T?
WE-LAN LAN Transformer, SMT, 1000 Base-T, 1 port; Manufacturer Part Number: 7490240142; Manufacturer: Wurth Elektronik; PoE Current: 0; Turns Ratio: 1:1; HPLE: No; Number of Ports: 1; Inductance: 350uH; Insulation Test Voltage: 4000Vrms; ComponentLink1Description: Manufacturer; ComponentLink1URL: http://www.we-online.de; ComponentLink2Description: Datasheet; ComponentLink2URL: https://www.we-online.com/catalog/datasheet/7490240142.pdf; Operating Temperature: 0 to +70degC; Published Date: March 2020; Packaging: Tape and Reel; Data Rate: 1000 Base-T; Mounting Technology: SMT
footprint 7490240142
pins: 1 CD1, 2 D1+, 3 D1-, 4 CD2, 5 D2+, 6 D2-, 7 CD3, 8 D3+, 9 D3-, 10 CD4, 11 D4+, 12 D4-, 13 X4-, 14 X4+, 15 CX4, 16 X3-, 17 X3+, 18 CX3, 19 X2-, 20 X2+, 21 CX2, 22 X1-, 23 X1+, 24 CX1